# Altium footprint library Sajad_Altium_Library.PcbLib: 380 footprints (part 16 of 24)
Each footprint in its own frame and in the unit in brackets; x right, y up, seen from the top. Pads: shape width x height; smd on the part's side, far side on the other; paste and mask are expansions set on the pad; w line width, h text height; cw(c..) or ccw(c..) is an arc to the next point about the centre after c.
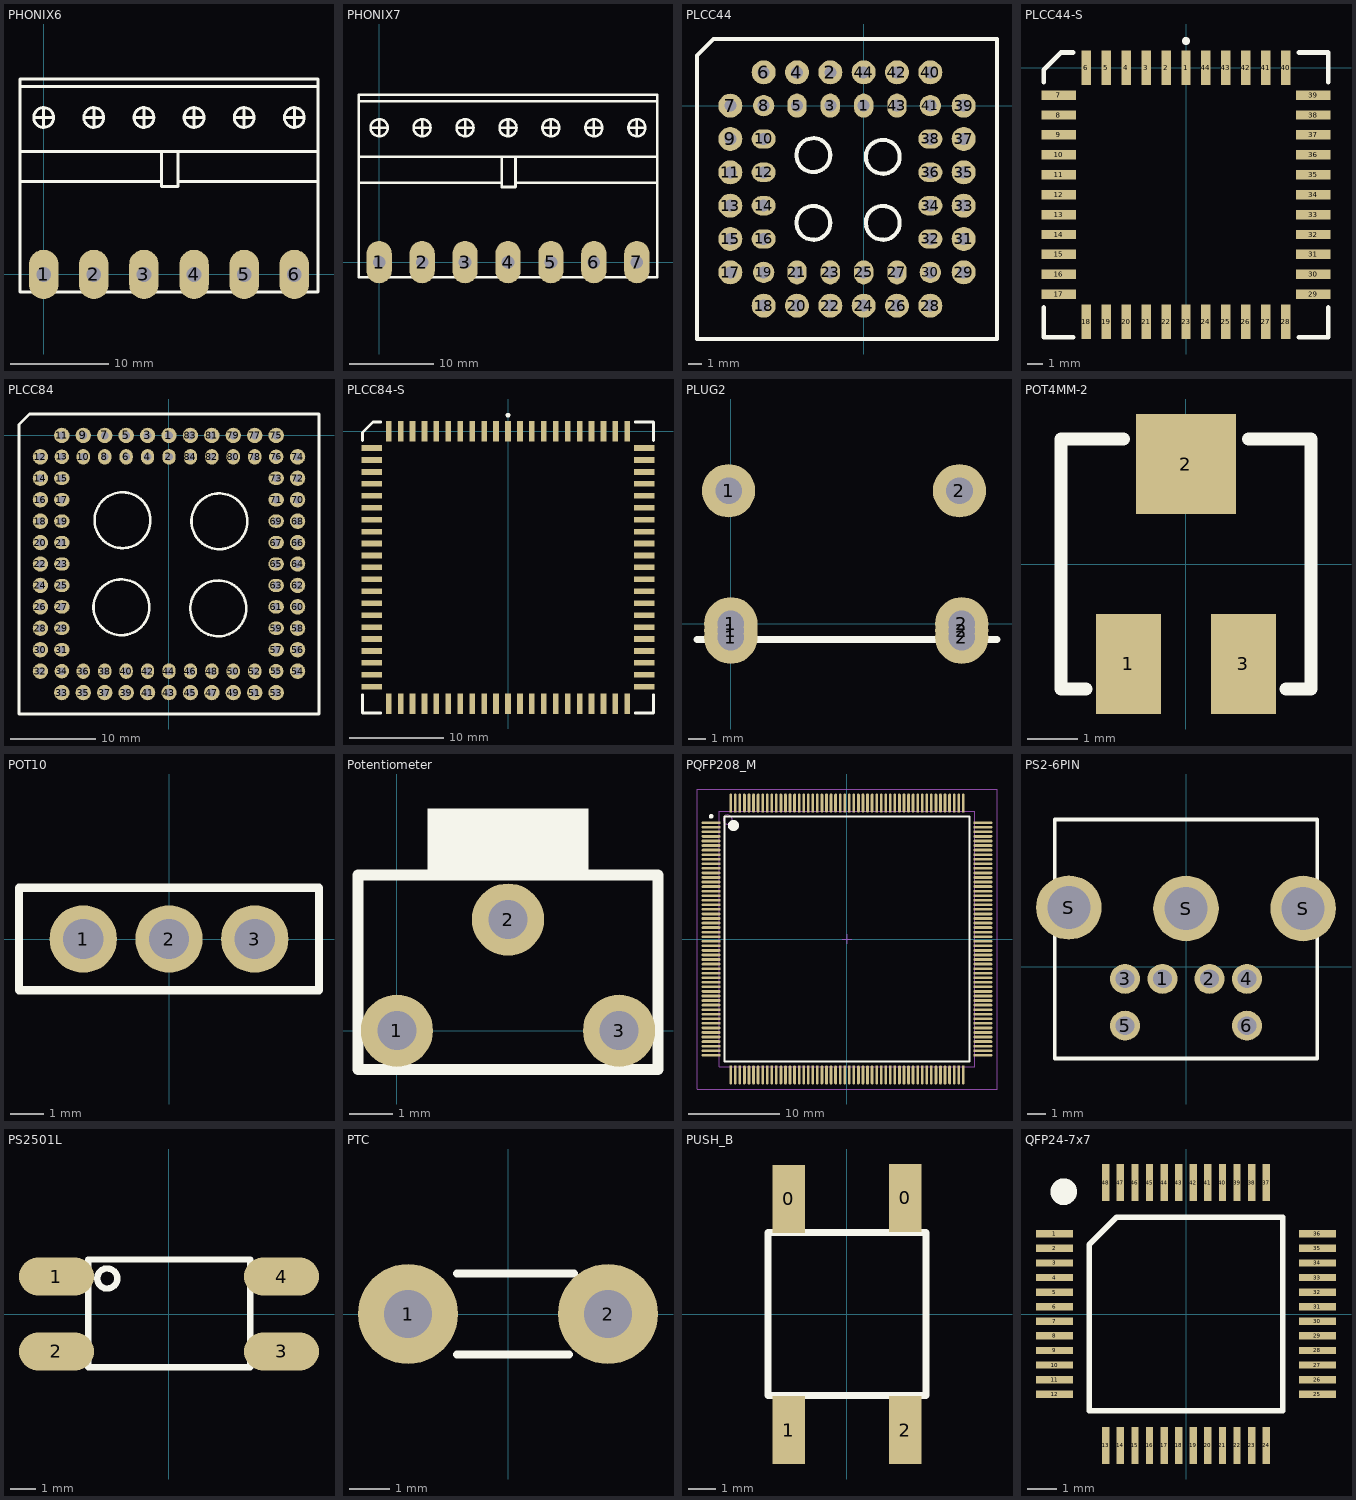
[diagram p15: the footprints below, top view; thin cyan lines are the x and y axes]

## PHONIX6 [mm]
pads (6):
  oval 3x5 hole 1.5: 1(0,0) 2(5.08,0) 3(10.16,0) 4(15.24,0) 5(20.32,0) 6(25.4,0)
Top Overlay:
  circle w0.3: c25.4,15.9 r1.006
  circle w0.3: c20.32,15.9 r1.006
  circle w0.3: c5.08,15.9 r1.006
  circle w0.3: c0,15.9 r1.006
  circle w0.3: c10.16,15.9 r1.006
  circle w0.3: c15.24,15.9 r1.006
  lines w0.3: -2.286,19.05 27.813,19.05 ; -0.864,15.9 0.838,15.9 ; 0,15.062 0,16.688 ; 4.216,15.9 5.918,15.9 ; 5.08,15.062 5.08,16.688 ; 9.296,15.9 10.998,15.9 ; 10.16,15.062 10.16,16.688 ; 14.376,15.9 16.078,15.9 ; 15.24,15.062 15.24,16.688 ; 19.456,15.9 21.158,15.9 ; 20.32,15.062 20.32,16.688 ; 24.536,15.9 26.238,15.9 ; 25.4,15.062 25.4,16.688
  lines w0.305: -2.413,9.398 11.938,9.398 ; -2.413,12.446 27.813,12.446 ; 11.938,12.319 11.938,8.89 13.589,8.89 13.589,12.446 ; 13.589,9.398 27.813,9.398 ; -2.413,-1.778 -2.413,19.812 27.813,19.812 27.813,-1.778 -2.413,-1.778

## PHONIX7 [mm]
pads (7):
  oval 3x5 hole 1.5: 1(0,0) 2(5.08,0) 3(10.16,0) 4(15.24,0) 5(20.32,0) 6(25.4,0) 7(30.48,0)
Top Overlay:
  circle w0.3: c15.24,15.9 r1.006
  circle w0.3: c10.16,15.9 r1.006
  circle w0.3: c0,15.9 r1.006
  circle w0.3: c5.08,15.9 r1.006
  circle w0.3: c20.32,15.9 r1.006
  circle w0.3: c25.4,15.9 r1.006
  circle w0.3: c30.48,15.9 r1.006
  lines w0.3: -2.286,19.05 32.893,19.05 ; -0.864,15.9 0.838,15.9 ; 0,15.062 0,16.688 ; 4.216,15.9 5.918,15.9 ; 5.08,15.062 5.08,16.688 ; 9.296,15.9 10.998,15.9 ; 10.16,15.062 10.16,16.688 ; 14.376,15.9 16.078,15.9 ; 15.24,15.062 15.24,16.688 ; 19.456,15.9 21.158,15.9 ; 20.32,15.062 20.32,16.688 ; 24.536,15.9 26.238,15.9 ; 25.4,15.062 25.4,16.688 ; 29.616,15.9 31.318,15.9 ; 30.48,15.062 30.48,16.688
  lines w0.305: -2.413,12.446 32.766,12.446 ; -2.286,9.398 14.478,9.398 ; 14.478,12.319 14.478,8.89 16.129,8.89 16.129,12.446 ; 16.129,9.398 32.893,9.398 ; -2.413,-1.778 32.893,-1.778 32.893,19.812 -2.413,19.812 -2.413,-1.778

## PLCC44 [mm]
pads (44):
  oval 1.45x1.8 hole 0.9: 1(0,0) 3(-2.5,0) 5(-5,0) 21(-5,-12.5) 23(-2.5,-12.5) 25(0,-12.5) 27(2.5,-12.5) 43(2.5,0)
  round 1.8 hole 0.9: 2(-2.5,2.5) 4(-5,2.5) 6(-7.5,2.5) 7(-10,0) 9(-10,-2.5) 11(-10,-5) 13(-10,-7.5) 15(-10,-10) 17(-10,-12.5) 18(-7.5,-15) 20(-5,-15) 22(-2.5,-15) 24(0,-15) 26(2.5,-15) 28(5,-15) 29(7.5,-12.5) 31(7.5,-10) 33(7.5,-7.5) 35(7.5,-5) 37(7.5,-2.5) 39(7.5,0) 40(5,2.5) 42(2.5,2.5) 44(0,2.5)
  round 1.6 hole 0.9: 8(-7.5,0) 19(-7.5,-12.5) 30(5,-12.5) 41(5,0)
  oval 1.8x1.45 hole 0.9: 10(-7.5,-2.5) 12(-7.5,-5) 14(-7.5,-7.5) 16(-7.5,-10) 32(5,-10) 34(5,-7.5) 36(5,-5) 38(5,-2.5)
Top Overlay:
  circle w0.305: c1.433,-8.789 r1.27
  circle w0.305: c-3.774,-8.789 r1.27
  circle w0.305: c1.433,-3.836 r1.27
  circle w0.305: c-3.774,-3.709 r1.27
  lines w0.305: -12.5,-17.5 10,-17.5 10,5 -11.25,5 -12.5,3.75 -12.5,-17.5

## PLCC44-S [mm]
pads (44):
  rect 0.6x2.2 smd: 1(0,0) 2(-1.27,0) 3(-2.54,0) 4(-3.81,0) 5(-5.08,0) 6(-6.35,0) 18(-6.35,-16.2) 19(-5.08,-16.2) 20(-3.81,-16.2) 21(-2.54,-16.2) 22(-1.27,-16.2) 23(0,-16.2) 24(1.27,-16.2) 25(2.54,-16.2) 26(3.81,-16.2) 27(5.08,-16.2) 28(6.35,-16.2) 40(6.35,0) 41(5.08,0) 42(3.81,0) 43(2.54,0) 44(1.27,0)
  rect 2.2x0.6 smd: 7(-8.1,-1.75) 8(-8.1,-3.02) 9(-8.1,-4.29) 10(-8.1,-5.56) 11(-8.1,-6.83) 12(-8.1,-8.1) 13(-8.1,-9.37) 14(-8.1,-10.64) 15(-8.1,-11.91) 16(-8.1,-13.18) 17(-8.1,-14.45) 29(8.1,-14.45) 30(8.1,-13.18) 31(8.1,-11.91) 32(8.1,-10.64) 33(8.1,-9.37) 34(8.1,-8.1) 35(8.1,-6.83) 36(8.1,-5.56) 37(8.1,-4.29) 38(8.1,-3.02) 39(8.1,-1.75)
Top Overlay:
  circle w0.25: c0,1.7 r0.125
  lines w0.305: -9.075,-15.298 -9.075,-17.187 -7.185,-17.187 ; -9.075,-0.928 -9.075,-0.137 -7.975,0.963 -7.185,0.963 ; 7.185,-17.187 9.075,-17.187 9.075,-15.298 ; 7.185,0.963 9.075,0.963 9.075,-0.928

## PLCC84 [mm]
pads (84):
  round 1.8 hole 0.9: 1(0,0) 3(-2.5,0) 5(-5,0) 7(-7.5,0) 9(-10,0) 11(-12.5,0) 12(-15,-2.5) 14(-15,-5) 16(-15,-7.5) 18(-15,-10) 20(-15,-12.5) 22(-15,-15) 24(-15,-17.5) 26(-15,-20) 28(-15,-22.5) 30(-15,-25) 32(-15,-27.5) 33(-12.5,-30) 35(-10,-30) 37(-7.5,-30) 39(-5,-30) 41(-2.5,-30) 43(0,-30) 45(2.5,-30) 47(5,-30) 49(7.5,-30) 51(10,-30) 53(12.5,-30) 54(15,-27.5) 56(15,-25) 58(15,-22.5) 60(15,-20) 62(15,-17.5) 64(15,-15) 66(15,-12.5) 68(15,-10) 70(15,-7.5) 72(15,-5) 74(15,-2.5) 75(12.5,0) 77(10,0) 79(7.5,0) 81(5,0) 83(2.5,0)
  oval 1.55x1.8 hole 0.9: 2(0,-2.5) 4(-2.5,-2.5) 6(-5,-2.5) 8(-7.5,-2.5) 10(-10,-2.5) 36(-10,-27.5) 38(-7.5,-27.5) 40(-5,-27.5) 42(-2.5,-27.5) 44(0,-27.5) 46(2.5,-27.5) 48(5,-27.5) 50(7.5,-27.5) 52(10,-27.5) 78(10,-2.5) 80(7.5,-2.5) 82(5,-2.5) 84(2.5,-2.5)
  round 1.7 hole 0.9 unplated: 13(-12.5,-2.5) 34(-12.5,-27.5) 55(12.5,-27.5) 76(12.5,-2.5)
  oval 1.8x1.55 hole 0.9: 15(-12.5,-5) 17(-12.5,-7.5) 19(-12.5,-10) 21(-12.5,-12.5) 23(-12.5,-15) 25(-12.5,-17.5) 27(-12.5,-20) 29(-12.5,-22.5) 31(-12.5,-25) 57(12.5,-25) 59(12.5,-22.5) 61(12.5,-20) 63(12.5,-17.5) 65(12.5,-15) 67(12.5,-12.5) 69(12.5,-10) 71(12.5,-7.5) 73(12.5,-5)
Top Overlay:
  circle w0.305: c-5.425,-9.892 r3.255
  circle w0.305: c5.878,-10.019 r3.255
  circle w0.305: c-5.552,-20.052 r3.255
  circle w0.305: c5.751,-20.179 r3.255
  lines w0.3: -17.5,-32.5 -17.5,1.25 -16.25,2.5 17.5,2.5 17.5,-32.5 -17.5,-32.5

## PLCC84-S [mm]
pads (84):
  rect 0.6x2.2 smd: 1(0,0) 2(-1.27,0) 3(-2.54,0) 4(-3.81,0) 5(-5.08,0) 6(-6.35,0) 7(-7.62,0) 8(-8.89,0) 9(-10.16,0) 10(-11.43,0) 11(-12.7,0) 33(-12.7,-29) 34(-11.43,-29) 35(-10.16,-29) 36(-8.89,-29) 37(-7.62,-29) 38(-6.35,-29) 39(-5.08,-29) 40(-3.81,-29) 41(-2.54,-29) 42(-1.27,-29) 43(0,-29) 44(1.27,-29) 45(2.54,-29) 46(3.81,-29) 47(5.08,-29) 48(6.35,-29) 49(7.62,-29) 50(8.89,-29) 51(10.16,-29) 52(11.43,-29) 53(12.7,-29) 75(12.7,0) 76(11.43,0) 77(10.16,0) 78(8.89,0) 79(7.62,0) 80(6.35,0) 81(5.08,0) 82(3.81,0) 83(2.54,0) 84(1.27,0)
  rect 2.2x0.6 smd: 12(-14.5,-1.8) 13(-14.5,-3.07) 14(-14.5,-4.34) 15(-14.5,-5.61) 16(-14.5,-6.88) 17(-14.5,-8.15) 18(-14.5,-9.42) 19(-14.5,-10.69) 20(-14.5,-11.96) 21(-14.5,-13.23) 22(-14.5,-14.5) 23(-14.5,-15.77) 24(-14.5,-17.04) 25(-14.5,-18.31) 26(-14.5,-19.58) 27(-14.5,-20.85) 28(-14.5,-22.12) 29(-14.5,-23.39) 30(-14.5,-24.66) 31(-14.5,-25.93) 32(-14.5,-27.2) 54(14.5,-27.2) 55(14.5,-25.93) 56(14.5,-24.66) 57(14.5,-23.39) 58(14.5,-22.12) 59(14.5,-20.85) 60(14.5,-19.58) 61(14.5,-18.31) 62(14.5,-17.04) 63(14.5,-15.77) 64(14.5,-14.5) 65(14.5,-13.23) 66(14.5,-11.96) 67(14.5,-10.69) 68(14.5,-9.42) 69(14.5,-8.15) 70(14.5,-6.88) 71(14.5,-5.61) 72(14.5,-4.34) 73(14.5,-3.07) 74(14.5,-1.8)
Top Overlay:
  circle w0.25: c0,1.7 r0.125
  lines w0.305: -15.475,-28.047 -15.475,-29.987 -13.535,-29.987 ; -15.475,-0.977 -15.475,-0.137 -14.375,0.963 -13.535,0.963 ; 13.535,-29.987 15.475,-29.987 15.475,-28.047 ; 13.535,0.963 15.475,0.963 15.475,-0.977

## PLUG2 [mm]
height 19.6
pads (8):
  round 3 hole 1.5: 1(-0.127,7.493) 1(0,-0.762) 1(0,-0.381) 1(0,0) 2(12.873,7.493) 2(13,-0.762) 2(13,-0.381) 2(13,0)
Top Overlay:
  lines w0.4: -1.905,-0.889 14.986,-0.889

## POT4MM-2 [mm]
height 4.45
pads (3):
  rect 1.3x2 smd: 1(-1.15,-2) 3(1.15,-2)
  rect 2x2 smd: 2(0,2)
Top Overlay:
  lines w0.254: -2,-2.5 -2.5,-2.5 -2.5,2.5 -1.25,2.5 ; 1.25,2.5 2.5,2.5 2.5,-2.5 2,-2.5

## POT10 [mm]
height 0.55
pads (3):
  round 2 hole 1.2: 1(-2.54,0) 2(0,0) 3(2.54,0)
Top Overlay:
  lines w0.25: -4.445,-1.524 -4.445,1.524 4.445,1.524 4.445,-1.524 -4.445,-1.524

## Potentiometer [mil] "potentiometer standing"
pads (3):
  round 65 hole 35: 1(0,0) 2(100,100) 3(200,0)
Top Overlay:
  rectangle: 27.5,140 172.5,200
  lines w10: -35,-35 235,-35 235,140 -35,140 -35,-35

## PQFP208_M [mm] "208-Pin Shrink Quad Flat Pack 0.5 mm Pitch, IPC Low Density"
height 4.1
pads (208):
  oval 2.1x0.3 smd: 1(-14.9,12.75) 2(-14.9,12.25) 3(-14.9,11.75) 4(-14.9,11.25) 5(-14.9,10.75) 6(-14.9,10.25) 7(-14.9,9.75) 8(-14.9,9.25) 9(-14.9,8.75) 10(-14.9,8.25) 11(-14.9,7.75) 12(-14.9,7.25) 13(-14.9,6.75) 14(-14.9,6.25) 15(-14.9,5.75) 16(-14.9,5.25) 17(-14.9,4.75) 18(-14.9,4.25) 19(-14.9,3.75) 20(-14.9,3.25) 21(-14.9,2.75) 22(-14.9,2.25) 23(-14.9,1.75) 24(-14.9,1.25) 25(-14.9,0.75) 26(-14.9,0.25) 27(-14.9,-0.25) 28(-14.9,-0.75) 29(-14.9,-1.25) 30(-14.9,-1.75) 31(-14.9,-2.25) 32(-14.9,-2.75) 33(-14.9,-3.25) 34(-14.9,-3.75) 35(-14.9,-4.25) 36(-14.9,-4.75) 37(-14.9,-5.25) 38(-14.9,-5.75) 39(-14.9,-6.25) 40(-14.9,-6.75) 41(-14.9,-7.25) 42(-14.9,-7.75) 43(-14.9,-8.25) 44(-14.9,-8.75) 45(-14.9,-9.25) 46(-14.9,-9.75) 47(-14.9,-10.25) 48(-14.9,-10.75) 49(-14.9,-11.25) 50(-14.9,-11.75) 51(-14.9,-12.25) 52(-14.9,-12.75) 105(14.9,-12.75) 106(14.9,-12.25) 107(14.9,-11.75) 108(14.9,-11.25) 109(14.9,-10.75) 110(14.9,-10.25) 111(14.9,-9.75) 112(14.9,-9.25) 113(14.9,-8.75) 114(14.9,-8.25) 115(14.9,-7.75) 116(14.9,-7.25) 117(14.9,-6.75) 118(14.9,-6.25) 119(14.9,-5.75) 120(14.9,-5.25) 121(14.9,-4.75) 122(14.9,-4.25) 123(14.9,-3.75) 124(14.9,-3.25) 125(14.9,-2.75) 126(14.9,-2.25) 127(14.9,-1.75) 128(14.9,-1.25) 129(14.9,-0.75) 130(14.9,-0.25) 131(14.9,0.25) 132(14.9,0.75) 133(14.9,1.25) 134(14.9,1.75) 135(14.9,2.25) 136(14.9,2.75) 137(14.9,3.25) 138(14.9,3.75) 139(14.9,4.25) 140(14.9,4.75) 141(14.9,5.25) 142(14.9,5.75) 143(14.9,6.25) 144(14.9,6.75) 145(14.9,7.25) 146(14.9,7.75) 147(14.9,8.25) 148(14.9,8.75) 149(14.9,9.25) 150(14.9,9.75) 151(14.9,10.25) 152(14.9,10.75) 153(14.9,11.25) 154(14.9,11.75) 155(14.9,12.25) 156(14.9,12.75)
  oval 0.3x2.1 smd: 53(-12.75,-14.9) 54(-12.25,-14.9) 55(-11.75,-14.9) 56(-11.25,-14.9) 57(-10.75,-14.9) 58(-10.25,-14.9) 59(-9.75,-14.9) 60(-9.25,-14.9) 61(-8.75,-14.9) 62(-8.25,-14.9) 63(-7.75,-14.9) 64(-7.25,-14.9) 65(-6.75,-14.9) 66(-6.25,-14.9) 67(-5.75,-14.9) 68(-5.25,-14.9) 69(-4.75,-14.9) 70(-4.25,-14.9) 71(-3.75,-14.9) 72(-3.25,-14.9) 73(-2.75,-14.9) 74(-2.25,-14.9) 75(-1.75,-14.9) 76(-1.25,-14.9) 77(-0.75,-14.9) 78(-0.25,-14.9) 79(0.25,-14.9) 80(0.75,-14.9) 81(1.25,-14.9) 82(1.75,-14.9) 83(2.25,-14.9) 84(2.75,-14.9) 85(3.25,-14.9) 86(3.75,-14.9) 87(4.25,-14.9) 88(4.75,-14.9) 89(5.25,-14.9) 90(5.75,-14.9) 91(6.25,-14.9) 92(6.75,-14.9) 93(7.25,-14.9) 94(7.75,-14.9) 95(8.25,-14.9) 96(8.75,-14.9) 97(9.25,-14.9) 98(9.75,-14.9) 99(10.25,-14.9) 100(10.75,-14.9) 101(11.25,-14.9) 102(11.75,-14.9) 103(12.25,-14.9) 104(12.75,-14.9) 157(12.75,14.9) 158(12.25,14.9) 159(11.75,14.9) 160(11.25,14.9) 161(10.75,14.9) 162(10.25,14.9) 163(9.75,14.9) 164(9.25,14.9) 165(8.75,14.9) 166(8.25,14.9) 167(7.75,14.9) 168(7.25,14.9) 169(6.75,14.9) 170(6.25,14.9) 171(5.75,14.9) 172(5.25,14.9) 173(4.75,14.9) 174(4.25,14.9) 175(3.75,14.9) 176(3.25,14.9) 177(2.75,14.9) 178(2.25,14.9) 179(1.75,14.9) 180(1.25,14.9) 181(0.75,14.9) 182(0.25,14.9) 183(-0.25,14.9) 184(-0.75,14.9) 185(-1.25,14.9) 186(-1.75,14.9) 187(-2.25,14.9) 188(-2.75,14.9) 189(-3.25,14.9) 190(-3.75,14.9) 191(-4.25,14.9) 192(-4.75,14.9) 193(-5.25,14.9) 194(-5.75,14.9) 195(-6.25,14.9) 196(-6.75,14.9) 197(-7.25,14.9) 198(-7.75,14.9) 199(-8.25,14.9) 200(-8.75,14.9) 201(-9.25,14.9) 202(-9.75,14.9) 203(-10.25,14.9) 204(-10.75,14.9) 205(-11.25,14.9) 206(-11.75,14.9) 207(-12.25,14.9) 208(-12.75,14.9)
Top Overlay:
  circle w0.25: c-14.9,13.45 r0.125
  circle w0.6: c-12.45,12.45 r0.3
  lines w0.2: -13.45,-13.45 -13.45,13.45 13.45,13.45 13.45,-13.45 -13.45,-13.45
Mechanical 13:
  circle w0.1: c-13.1,13.1 r0.5
  lines w0.1: -14,-14 -14,14 14,14 14,-14 -14,-14
Mechanical 15:
  lines w0.1: -0.5,0 0.5,0 ; 0,-0.5 0,0.5 ; -16.45,-16.45 -16.45,16.45 16.45,16.45 16.45,-16.45 -16.45,-16.45
3D body: height 4.1, standoff 0, extent -14,-14 14,14

## PS2-6PIN [mm]
pads (9):
  round 1.6 hole 1: 1(-1.25,-0.65) 2(1.25,-0.65) 3(-3.25,-0.65) 4(3.25,-0.65) 5(-3.25,-3.15) 6(3.25,-3.15)
  oval 3.5x3.4 hole 2.3: S(-6.25,3.15)
  round 3.5 hole 2.3: S(0,3.1) S(6.25,3.1)
Top Overlay:
  lines w0.2: -7,-4.9 -7,7.85 7,7.85 7,-4.9 -7,-4.9

## PS2501L [mm] "Opto"
height 0.55
pads (4):
  oval 3x1.524 smd: 1(-4.5,1.5) 2(-4.5,-1.5) 3(4.5,-1.5) 4(4.5,1.5)
Top Overlay:
  circle w0.254: c-2.468,1.421 r0.402
  lines w0.25: -3.23,-2.135 -3.23,2.183 3.247,2.183 3.247,-2.135 -3.23,-2.135

## PTC [mm] "PTC"
height 2.032
pads (2):
  round 2.5 hole 1.2: 1(-2.5,0) 2(2.5,0)
Top Overlay:
  lines w0.2: -1.27,-1.016 1.524,-1.016 ; -1.27,1.016 1.651,1.016

## PUSH_B [mm]
height 0.55
pads (4):
  rect 1.2x2.5 smd: 0(-2.15,4.239) 0(2.15,4.27) 1(-2.15,-4.27) 2(2.15,-4.27)
Top Overlay:
  lines w0.25: 2.905,-3 -2.912,-3 -2.912,3 2.905,3 ; 2.912,-3 2.912,3

## QFP24-7x7 [mm]
pads (48):
  rect 1.27x0.25 smd: 1(-4.504,2.75) 2(-4.504,2.25) 3(-4.504,1.75) 4(-4.504,1.25) 5(-4.504,0.75) 6(-4.504,0.25) 7(-4.504,-0.25) 8(-4.504,-0.75) 9(-4.504,-1.25) 10(-4.504,-1.75) 11(-4.504,-2.25) 12(-4.504,-2.75) 25(4.504,-2.75) 26(4.504,-2.25) 27(4.504,-1.75) 28(4.504,-1.25) 29(4.504,-0.75) 30(4.504,-0.25) 31(4.504,0.25) 32(4.504,0.75) 33(4.504,1.25) 34(4.504,1.75) 35(4.504,2.25) 36(4.504,2.75)
  rect 0.25x1.27 smd: 13(-2.75,-4.504) 14(-2.25,-4.504) 15(-1.75,-4.504) 16(-1.25,-4.504) 17(-0.75,-4.504) 18(-0.25,-4.504) 19(0.25,-4.504) 20(0.75,-4.504) 21(1.25,-4.504) 22(1.75,-4.504) 23(2.25,-4.504) 24(2.75,-4.504) 37(2.75,4.504) 38(2.25,4.504) 39(1.75,4.504) 40(1.25,4.504) 41(0.75,4.504) 42(0.25,4.504) 43(-0.25,4.504) 44(-0.75,4.504) 45(-1.25,4.504) 46(-1.75,4.504) 47(-2.25,4.504) 48(-2.75,4.504)
Top Overlay:
  circle w0.508: c-4.191,4.191 r0.203
  lines w0.2: -3.315,-3.315 -3.315,2.38 -2.38,3.315 3.315,3.315 3.315,-3.315 -3.315,-3.315